# Altium schematic symbol library SignalCommunications.SCHLIB: 804 symbols (part 4 of 9) (continued)
## WE-SD_7447150
designator L?, comment <b>Leaded Wire Wound Rodcore Inductor WE-SD HIGH CURRENT</b><p> / - Rated Current up to 20 A<br> / - Inductance is independent from rated DC current<br> / - Mechanical dimensions can be adjusted on customer request<br> / - High mechanical stability<p> / -- Swirching regulators<br> / -- Motors<br> / -- Power amplifiers<br> / -- Power supplies<br> / -- Especially designed for automotive industry<br> / -- Broadband filtering
footprint WE-SD_7447150
pins: 1, 2

## WE-SD_7447180
designator L?, comment <b>Leaded Wire Wound Rodcore Inductor WE-SD HIGH CURRENT</b><p> / - Rated Current up to 20 A<br> / - Inductance is independent from rated DC current<br> / - Mechanical dimensions can be adjusted on customer request<br> / - High mechanical stability<p> / -- Swirching regulators<br> / -- Motors<br> / -- Power amplifiers<br> / -- Power supplies<br> / -- Especially designed for automotive industry<br> / -- Broadband filtering
footprint WE-SD_7447180
pins: 1, 2

## WE-SD_744710203
designator L?, comment <b>Leaded Wire Wound Rodcore Inductor WE-SD HIGH CURRENT</b><p> / - Rated Current up to 20 A<br> / - Inductance is independent from rated DC current<br> / - Mechanical dimensions can be adjusted on customer request<br> / - High mechanical stability<p> / -- Swirching regulators<br> / -- Motors<br> / -- Power amplifiers<br> / -- Power supplies<br> / -- Especially designed for automotive industry<br> / -- Broadband filtering
footprint WE-SD_744710203
pins: 1, 2

## WE-SD_744710205
designator L?, comment <b>Leaded Wire Wound Rodcore Inductor WE-SD HIGH CURRENT</b><p> / - Rated Current up to 20 A<br> / - Inductance is independent from rated DC current<br> / - Mechanical dimensions can be adjusted on customer request<br> / - High mechanical stability<p> / -- Swirching regulators<br> / -- Motors<br> / -- Power amplifiers<br> / -- Power supplies<br> / -- Especially designed for automotive industry<br> / -- Broadband filtering
footprint WE-SD_744710205
pins: 1, 2

## WE-SD_744710210
designator L?, comment <b>Leaded Wire Wound Rodcore Inductor WE-SD HIGH CURRENT</b><p> / - Rated Current up to 20 A<br> / - Inductance is independent from rated DC current<br> / - Mechanical dimensions can be adjusted on customer request<br> / - High mechanical stability<p> / -- Swirching regulators<br> / -- Motors<br> / -- Power amplifiers<br> / -- Power supplies<br> / -- Especially designed for automotive industry<br> / -- Broadband filtering
footprint WE-SD_744710210
pins: 1, 2

## WE-SD_744710215
designator L?, comment <b>Leaded Wire Wound Rodcore Inductor WE-SD HIGH CURRENT</b><p> / - Rated Current up to 20 A<br> / - Inductance is independent from rated DC current<br> / - Mechanical dimensions can be adjusted on customer request<br> / - High mechanical stability<p> / -- Swirching regulators<br> / -- Motors<br> / -- Power amplifiers<br> / -- Power supplies<br> / -- Especially designed for automotive industry<br> / -- Broadband filtering
footprint WE-SD_744710215
pins: 1, 2

## WE-SD_744710603
designator L?, comment <b>Leaded Wire Wound Rodcore Inductor WE-SD HIGH CURRENT</b><p> / - Rated Current up to 20 A<br> / - Inductance is independent from rated DC current<br> / - Mechanical dimensions can be adjusted on customer request<br> / - High mechanical stability<p> / -- Swirching regulators<br> / -- Motors<br> / -- Power amplifiers<br> / -- Power supplies<br> / -- Especially designed for automotive industry<br> / -- Broadband filtering
footprint WE-SD_744710603
pins: 1, 2

## WE-SD_744710605
designator L?, comment <b>Leaded Wire Wound Rodcore Inductor WE-SD HIGH CURRENT</b><p> / - Rated Current up to 20 A<br> / - Inductance is independent from rated DC current<br> / - Mechanical dimensions can be adjusted on customer request<br> / - High mechanical stability<p> / -- Swirching regulators<br> / -- Motors<br> / -- Power amplifiers<br> / -- Power supplies<br> / -- Especially designed for automotive industry<br> / -- Broadband filtering
footprint WE-SD_744710605
pins: 1, 2

## WE-SD_744710610
designator L?, comment <b>Leaded Wire Wound Rodcore Inductor WE-SD HIGH CURRENT</b><p> / - Rated Current up to 20 A<br> / - Inductance is independent from rated DC current<br> / - Mechanical dimensions can be adjusted on customer request<br> / - High mechanical stability<p> / -- Swirching regulators<br> / -- Motors<br> / -- Power amplifiers<br> / -- Power supplies<br> / -- Especially designed for automotive industry<br> / -- Broadband filtering
footprint WE-SD_744710610
pins: 1, 2

## WE-SD_744710615
designator L?, comment <b>Leaded Wire Wound Rodcore Inductor WE-SD HIGH CURRENT</b><p> / - Rated Current up to 20 A<br> / - Inductance is independent from rated DC current<br> / - Mechanical dimensions can be adjusted on customer request<br> / - High mechanical stability<p> / -- Swirching regulators<br> / -- Motors<br> / -- Power amplifiers<br> / -- Power supplies<br> / -- Especially designed for automotive industry<br> / -- Broadband filtering
footprint WE-SD_744710615
pins: 1, 2

## WE-SD_744711003
designator L?, comment <b>Leaded Wire Wound Rodcore Inductor WE-SD HIGH CURRENT</b><p> / - Rated Current up to 20 A<br> / - Inductance is independent from rated DC current<br> / - Mechanical dimensions can be adjusted on customer request<br> / - High mechanical stability<p> / -- Swirching regulators<br> / -- Motors<br> / -- Power amplifiers<br> / -- Power supplies<br> / -- Especially designed for automotive industry<br> / -- Broadband filtering
footprint WE-SD_744711003
pins: 1, 2

## WE-SD_744711005
designator L?, comment <b>Leaded Wire Wound Rodcore Inductor WE-SD HIGH CURRENT</b><p> / - Rated Current up to 20 A<br> / - Inductance is independent from rated DC current<br> / - Mechanical dimensions can be adjusted on customer request<br> / - High mechanical stability<p> / -- Swirching regulators<br> / -- Motors<br> / -- Power amplifiers<br> / -- Power supplies<br> / -- Especially designed for automotive industry<br> / -- Broadband filtering
footprint WE-SD_744711005
pins: 1, 2

## WE-SD_744711010
designator L?, comment <b>Leaded Wire Wound Rodcore Inductor WE-SD HIGH CURRENT</b><p> / - Rated Current up to 20 A<br> / - Inductance is independent from rated DC current<br> / - Mechanical dimensions can be adjusted on customer request<br> / - High mechanical stability<p> / -- Swirching regulators<br> / -- Motors<br> / -- Power amplifiers<br> / -- Power supplies<br> / -- Especially designed for automotive industry<br> / -- Broadband filtering
footprint WE-SD_744711010
pins: 1, 2

## WE-SD_744711015
designator L?, comment <b>Leaded Wire Wound Rodcore Inductor WE-SD HIGH CURRENT</b><p> / - Rated Current up to 20 A<br> / - Inductance is independent from rated DC current<br> / - Mechanical dimensions can be adjusted on customer request<br> / - High mechanical stability<p> / -- Swirching regulators<br> / -- Motors<br> / -- Power amplifiers<br> / -- Power supplies<br> / -- Especially designed for automotive industry<br> / -- Broadband filtering
footprint WE-SD_744711015
pins: 1, 2

## WE-SEFC-0148
designator L?, comment <b>SMD EMI Contact Finger WE-SECF</b><p> / <b>Characteristics : </b><p> / Suitable for automated placement <br> / Material: copper-beryllium (CuBe) gold-plated (AU)<br> / Different types and sizes available <br> / Corrossion-resistant<br> / Wear-resistant <br> / High temperatures and mechenical weight have no influence on the excellent connection properties <br> / Reliable solderability <br> / Customize materials and platings are possible <br> / Customized types and sizes are possible<br> / <br> / <b>APPLICATIONS :</b><p> / Contact between PCB's earth and housing  <br> / Low Ω HF connection between earthing points of two PCB's lying upon each other <br> / Earthing of cooling units on high frequency  <br> / Connection between signal and power supply of two PCB's on track  <br> / Connection between PCB's and extern elements  <br>
MANUFACTURER: Würth Elektronik eiSos GmbH; CREATED-BY: Christin Otto; COMPANY-URL: http://www.we-online.de; CREATED-DATE: MAR 2013; DATASHEET-URL: http://katalog.we-online.de/pbs/datasheet/331011452048.pdf
footprint WE-SECF_0148
pins: 1 P$1 (power)

## WE-SEFC-0315
designator L?, comment <b>SMD EMI Contact Finger WE-SECF</b><p> / <b>Characteristics : </b><p> / Suitable for automated placement <br> / Material: copper-beryllium (CuBe) gold-plated (AU)<br> / Different types and sizes available <br> / Corrossion-resistant<br> / Wear-resistant <br> / High temperatures and mechenical weight have no influence on the excellent connection properties <br> / Reliable solderability <br> / Customize materials and platings are possible <br> / Customized types and sizes are possible<br> / <br> / <b>APPLICATIONS :</b><p> / Contact between PCB's earth and housing  <br> / Low Ω HF connection between earthing points of two PCB's lying upon each other <br> / Earthing of cooling units on high frequency  <br> / Connection between signal and power supply of two PCB's on track  <br> / Connection between PCB's and extern elements  <br>
MANUFACTURER: Würth Elektronik eiSos GmbH; CREATED-BY: Christin Otto; COMPANY-URL: http://www.we-online.de; CREATED-DATE: MAR 2013; DATASHEET-URL: http://katalog.we-online.de/pbs/datasheet/331031321515.pdf
footprint WE-SECF_0315
pins: 1 P$1 (power)

## WE-SEFC-0320
designator L?, comment <b>SMD EMI Contact Finger WE-SECF</b><p> / <b>Characteristics : </b><p> / Suitable for automated placement <br> / Material: copper-beryllium (CuBe) gold-plated (AU)<br> / Different types and sizes available <br> / Corrossion-resistant<br> / Wear-resistant <br> / High temperatures and mechenical weight have no influence on the excellent connection properties <br> / Reliable solderability <br> / Customize materials and platings are possible <br> / Customized types and sizes are possible<br> / <br> / <b>APPLICATIONS :</b><p> / Contact between PCB's earth and housing  <br> / Low Ω HF connection between earthing points of two PCB's lying upon each other <br> / Earthing of cooling units on high frequency  <br> / Connection between signal and power supply of two PCB's on track  <br> / Connection between PCB's and extern elements  <br>
MANUFACTURER: Würth Elektronik eiSos GmbH; CREATED-BY: Christin Otto; COMPANY-URL: http://www.we-online.de; CREATED-DATE: MAR 2013; DATASHEET-URL: http://katalog.we-online.de/pbs/datasheet/331031271520.pdf
footprint WE-SECF_0320
pins: 1 P$1 (power)

## WE-SEFC-0453
designator L?, comment <b>SMD EMI Contact Finger WE-SECF</b><p> / <b>Characteristics : </b><p> / Suitable for automated placement <br> / Material: copper-beryllium (CuBe) gold-plated (AU)<br> / Different types and sizes available <br> / Corrossion-resistant<br> / Wear-resistant <br> / High temperatures and mechenical weight have no influence on the excellent connection properties <br> / Reliable solderability <br> / Customize materials and platings are possible <br> / Customized types and sizes are possible<br> / <br> / <b>APPLICATIONS :</b><p> / Contact between PCB's earth and housing  <br> / Low Ω HF connection between earthing points of two PCB's lying upon each other <br> / Earthing of cooling units on high frequency  <br> / Connection between signal and power supply of two PCB's on track  <br> / Connection between PCB's and extern elements  <br>
MANUFACTURER: Würth Elektronik eiSos GmbH; CREATED-BY: Christin Otto; COMPANY-URL: http://www.we-online.de; CREATED-DATE: MAR 2013; DATASHEET-URL: http://katalog.we-online.de/pbs/datasheet/331041402053.pdf
footprint WE-SECF_0453
pins: 1 P$1 (power)

## WE-SEFC-0557
designator L?, comment <b>SMD EMI Contact Finger WE-SECF</b><p> / <b>Characteristics : </b><p> / Suitable for automated placement <br> / Material: copper-beryllium (CuBe) gold-plated (AU)<br> / Different types and sizes available <br> / Corrossion-resistant<br> / Wear-resistant <br> / High temperatures and mechenical weight have no influence on the excellent connection properties <br> / Reliable solderability <br> / Customize materials and platings are possible <br> / Customized types and sizes are possible<br> / <br> / <b>APPLICATIONS :</b><p> / Contact between PCB's earth and housing  <br> / Low Ω HF connection between earthing points of two PCB's lying upon each other <br> / Earthing of cooling units on high frequency  <br> / Connection between signal and power supply of two PCB's on track  <br> / Connection between PCB's and extern elements  <br>
MANUFACTURER: Würth Elektronik eiSos GmbH; CREATED-BY: Christin Otto; COMPANY-URL: http://www.we-online.de; CREATED-DATE: MAR 2013; DATASHEET-URL: http://katalog.we-online.de/pbs/datasheet/331051472057.pdf
footprint WE-SECF-0557
pins: 1 P$1 (power)

## WE-SEFC-0610
designator L?, comment <b>SMD EMI Contact Finger WE-SECF</b><p> / <b>Characteristics : </b><p> / Suitable for automated placement <br> / Material: copper-beryllium (CuBe) gold-plated (AU)<br> / Different types and sizes available <br> / Corrossion-resistant<br> / Wear-resistant <br> / High temperatures and mechenical weight have no influence on the excellent connection properties <br> / Reliable solderability <br> / Customize materials and platings are possible <br> / Customized types and sizes are possible<br> / <br> / <b>APPLICATIONS :</b><p> / Contact between PCB's earth and housing  <br> / Low Ω HF connection between earthing points of two PCB's lying upon each other <br> / Earthing of cooling units on high frequency  <br> / Connection between signal and power supply of two PCB's on track  <br> / Connection between PCB's and extern elements  <br>
MANUFACTURER: Würth Elektronik eiSos GmbH; CREATED-BY: Christin Otto; COMPANY-URL: http://www.we-online.de; CREATED-DATE: MAR 2013; DATASHEET-URL: http://katalog.we-online.de/pbs/datasheet/331061603010.pdf
footprint WE-SECF_0610
pins: 1 P$1 (power)

## WE-SEFC-0825
designator L?, comment <b>SMD EMI Contact Finger WE-SECF</b><p> / <b>Characteristics : </b><p> / Suitable for automated placement <br> / Material: copper-beryllium (CuBe) gold-plated (AU)<br> / Different types and sizes available <br> / Corrossion-resistant<br> / Wear-resistant <br> / High temperatures and mechenical weight have no influence on the excellent connection properties <br> / Reliable solderability <br> / Customize materials and platings are possible <br> / Customized types and sizes are possible<br> / <br> / <b>APPLICATIONS :</b><p> / Contact between PCB's earth and housing  <br> / Low Ω HF connection between earthing points of two PCB's lying upon each other <br> / Earthing of cooling units on high frequency  <br> / Connection between signal and power supply of two PCB's on track  <br> / Connection between PCB's and extern elements  <br>
MANUFACTURER: Würth Elektronik eiSos GmbH; CREATED-BY: Christin Otto; COMPANY-URL: http://www.we-online.de; CREATED-DATE: MAR 2013; DATASHEET-URL: http://katalog.we-online.de/pbs/datasheet/331081302025.pdf
footprint WE-SECF_0825
pins: 1 P$1 (power)

## WE-SEFC-1440
designator L?, comment <b>SMD EMI Contact Finger WE-SECF</b><p> / <b>Characteristics : </b><p> / Suitable for automated placement <br> / Material: copper-beryllium (CuBe) gold-plated (AU)<br> / Different types and sizes available <br> / Corrossion-resistant<br> / Wear-resistant <br> / High temperatures and mechenical weight have no influence on the excellent connection properties <br> / Reliable solderability <br> / Customize materials and platings are possible <br> / Customized types and sizes are possible<br> / <br> / <b>APPLICATIONS :</b><p> / Contact between PCB's earth and housing  <br> / Low Ω HF connection between earthing points of two PCB's lying upon each other <br> / Earthing of cooling units on high frequency  <br> / Connection between signal and power supply of two PCB's on track  <br> / Connection between PCB's and extern elements  <br>
MANUFACTURER: Würth Elektronik eiSos GmbH; CREATED-BY: Christin Otto; COMPANY-URL: http://www.we-online.de; CREATED-DATE: MAR 2013; DATASHEET-URL: http://katalog.we-online.de/pbs/datasheet/331141352540.pdf
footprint WE-SECF_1440
pins: 1 P$1 (power)

## WE-SEFC-1562
designator L?, comment <b>SMD EMI Contact Finger WE-SECF</b><p> / <b>Characteristics : </b><p> / Suitable for automated placement <br> / Material: copper-beryllium (CuBe) gold-plated (AU)<br> / Different types and sizes available <br> / Corrossion-resistant<br> / Wear-resistant <br> / High temperatures and mechenical weight have no influence on the excellent connection properties <br> / Reliable solderability <br> / Customize materials and platings are possible <br> / Customized types and sizes are possible<br> / <br> / <b>APPLICATIONS :</b><p> / Contact between PCB's earth and housing  <br> / Low Ω HF connection between earthing points of two PCB's lying upon each other <br> / Earthing of cooling units on high frequency  <br> / Connection between signal and power supply of two PCB's on track  <br> / Connection between PCB's and extern elements  <br>
MANUFACTURER: Würth Elektronik eiSos GmbH; CREATED-BY: Christin Otto; COMPANY-URL: http://www.we-online.de; CREATED-DATE: MAR 2013; DATASHEET-URL: http://katalog.we-online.de/pbs/datasheet/331151702562.pdf
footprint WE-SECF-1562
pins: 1 P$1 (power)

## WE-SEFC-1613
designator L?, comment <b>SMD EMI Contact Finger WE-SECF</b><p> / <b>Characteristics : </b><p> / Suitable for automated placement <br> / Material: copper-beryllium (CuBe) gold-plated (AU)<br> / Different types and sizes available <br> / Corrossion-resistant<br> / Wear-resistant <br> / High temperatures and mechenical weight have no influence on the excellent connection properties <br> / Reliable solderability <br> / Customize materials and platings are possible <br> / Customized types and sizes are possible<br> / <br> / <b>APPLICATIONS :</b><p> / Contact between PCB's earth and housing  <br> / Low Ω HF connection between earthing points of two PCB's lying upon each other <br> / Earthing of cooling units on high frequency  <br> / Connection between signal and power supply of two PCB's on track  <br> / Connection between PCB's and extern elements  <br>
MANUFACTURER: Würth Elektronik eiSos GmbH; CREATED-BY: Christin Otto; COMPANY-URL: http://www.we-online.de; CREATED-DATE: MAR 2013; DATASHEET-URL: http://katalog.we-online.de/pbs/datasheet/331161702513.pdf
footprint WE-SECF_1613
pins: 1 P$1 (power)

## WE-SEFC-1670
designator L?, comment <b>SMD EMI Contact Finger WE-SECF</b><p> / <b>Characteristics : </b><p> / Suitable for automated placement <br> / Material: copper-beryllium (CuBe) gold-plated (AU)<br> / Different types and sizes available <br> / Corrossion-resistant<br> / Wear-resistant <br> / High temperatures and mechenical weight have no influence on the excellent connection properties <br> / Reliable solderability <br> / Customize materials and platings are possible <br> / Customized types and sizes are possible<br> / <br> / <b>APPLICATIONS :</b><p> / Contact between PCB's earth and housing  <br> / Low Ω HF connection between earthing points of two PCB's lying upon each other <br> / Earthing of cooling units on high frequency  <br> / Connection between signal and power supply of two PCB's on track  <br> / Connection between PCB's and extern elements  <br>
MANUFACTURER: Würth Elektronik eiSos GmbH; CREATED-BY: Christin Otto; COMPANY-URL: http://www.we-online.de; CREATED-DATE: MAR 2013; DATASHEET-URL: http://katalog.we-online.de/pbs/datasheet/331161452070.pdf
footprint WE-SECF_1670
pins: 1 P$1 (power)

## WE-SEFC-1730
designator L?, comment <b>SMD EMI Contact Finger WE-SECF</b><p> / <b>Characteristics : </b><p> / Suitable for automated placement <br> / Material: copper-beryllium (CuBe) gold-plated (AU)<br> / Different types and sizes available <br> / Corrossion-resistant<br> / Wear-resistant <br> / High temperatures and mechenical weight have no influence on the excellent connection properties <br> / Reliable solderability <br> / Customize materials and platings are possible <br> / Customized types and sizes are possible<br> / <br> / <b>APPLICATIONS :</b><p> / Contact between PCB's earth and housing  <br> / Low Ω HF connection between earthing points of two PCB's lying upon each other <br> / Earthing of cooling units on high frequency  <br> / Connection between signal and power supply of two PCB's on track  <br> / Connection between PCB's and extern elements  <br>
MANUFACTURER: Würth Elektronik eiSos GmbH; CREATED-BY: Christin Otto; COMPANY-URL: http://www.we-online.de; CREATED-DATE: MAR 2013; DATASHEET-URL: http://katalog.we-online.de/pbs/datasheet/331171302030.pdf
footprint WE-SECF_1730
pins: 1 P$1 (power)

## WE-SEFC-1735
designator L?, comment <b>SMD EMI Contact Finger WE-SECF</b><p> / <b>Characteristics : </b><p> / Suitable for automated placement <br> / Material: copper-beryllium (CuBe) gold-plated (AU)<br> / Different types and sizes available <br> / Corrossion-resistant<br> / Wear-resistant <br> / High temperatures and mechenical weight have no influence on the excellent connection properties <br> / Reliable solderability <br> / Customize materials and platings are possible <br> / Customized types and sizes are possible<br> / <br> / <b>APPLICATIONS :</b><p> / Contact between PCB's earth and housing  <br> / Low Ω HF connection between earthing points of two PCB's lying upon each other <br> / Earthing of cooling units on high frequency  <br> / Connection between signal and power supply of two PCB's on track  <br> / Connection between PCB's and extern elements  <br>
MANUFACTURER: Würth Elektronik eiSos GmbH; CREATED-BY: Christin Otto; COMPANY-URL: http://www.we-online.de; CREATED-DATE: MAR 2013; DATASHEET-URL: http://katalog.we-online.de/pbs/datasheet/331171302035.pdf
footprint WE-SECF_1735
pins: 1 P$1 (power)

## WE-SEFC-2140
designator L?, comment <b>SMD EMI Contact Finger WE-SECF</b><p> / <b>Characteristics : </b><p> / Suitable for automated placement <br> / Material: copper-beryllium (CuBe) gold-plated (AU)<br> / Different types and sizes available <br> / Corrossion-resistant<br> / Wear-resistant <br> / High temperatures and mechenical weight have no influence on the excellent connection properties <br> / Reliable solderability <br> / Customize materials and platings are possible <br> / Customized types and sizes are possible<br> / <br> / <b>APPLICATIONS :</b><p> / Contact between PCB's earth and housing  <br> / Low Ω HF connection between earthing points of two PCB's lying upon each other <br> / Earthing of cooling units on high frequency  <br> / Connection between signal and power supply of two PCB's on track  <br> / Connection between PCB's and extern elements  <br>
MANUFACTURER: Würth Elektronik eiSos GmbH; CREATED-BY: Christin Otto; COMPANY-URL: http://www.we-online.de; CREATED-DATE: MAR 2013; DATASHEET-URL: http://katalog.we-online.de/pbs/datasheet/331211503040.pdf
footprint WE-SECF_2140
pins: 1 P$1 (power)

## WE-SEFC-2240
designator L?, comment <b>SMD EMI Contact Finger WE-SECF</b><p> / <b>Characteristics : </b><p> / Suitable for automated placement <br> / Material: copper-beryllium (CuBe) gold-plated (AU)<br> / Different types and sizes available <br> / Corrossion-resistant<br> / Wear-resistant <br> / High temperatures and mechenical weight have no influence on the excellent connection properties <br> / Reliable solderability <br> / Customize materials and platings are possible <br> / Customized types and sizes are possible<br> / <br> / <b>APPLICATIONS :</b><p> / Contact between PCB's earth and housing  <br> / Low Ω HF connection between earthing points of two PCB's lying upon each other <br> / Earthing of cooling units on high frequency  <br> / Connection between signal and power supply of two PCB's on track  <br> / Connection between PCB's and extern elements  <br>
MANUFACTURER: Würth Elektronik eiSos GmbH; CREATED-BY: Christin Otto; COMPANY-URL: http://www.we-online.de; CREATED-DATE: MAR 2013; DATASHEET-URL: http://katalog.we-online.de/pbs/datasheet/331221602040.pdf
footprint WE-SECF_2240
pins: 1 P$1 (power)

## WE-SHC_36103205
designator S?, comment WE-SHC Shielding cabinet
footprint WE-SHC_36103205
pins: 1 GND (power)

## WE-SHC_36103255
designator S?, comment WE-SHC Shielding cabinet
footprint WE-SHC_36103255
pins: 1 GND (power)

## WE-SHC_36103305
designator S?, comment WE-SHC Shielding cabinet
footprint WE-SHC_36103305
pins: 1 GND (power)

## WE-SHC_36103505
designator S?, comment WE-SHC Shielding cabinet
footprint WE-SHC_36103505
pins: 1 GND (power)

## WE-SHC_36103605
designator S?, comment WE-SHC Shielding cabinet
footprint WE-SHC_36103605
pins: 1 GND (power)

## WE-SHC_36503205
designator S?, comment WE-SHC Shielding cabinet
footprint WE-SHC_36503205
pins: 1 GND (power)

## WE-SHC_36503255
designator S?, comment WE-SHC Shielding cabinet
footprint WE-SHC_36503255
pins: 1 GND (power)

## WE-SHC_36503305
designator S?, comment WE-SHC Shielding cabinet
footprint WE-SHC_36503305
pins: 1 GND (power)

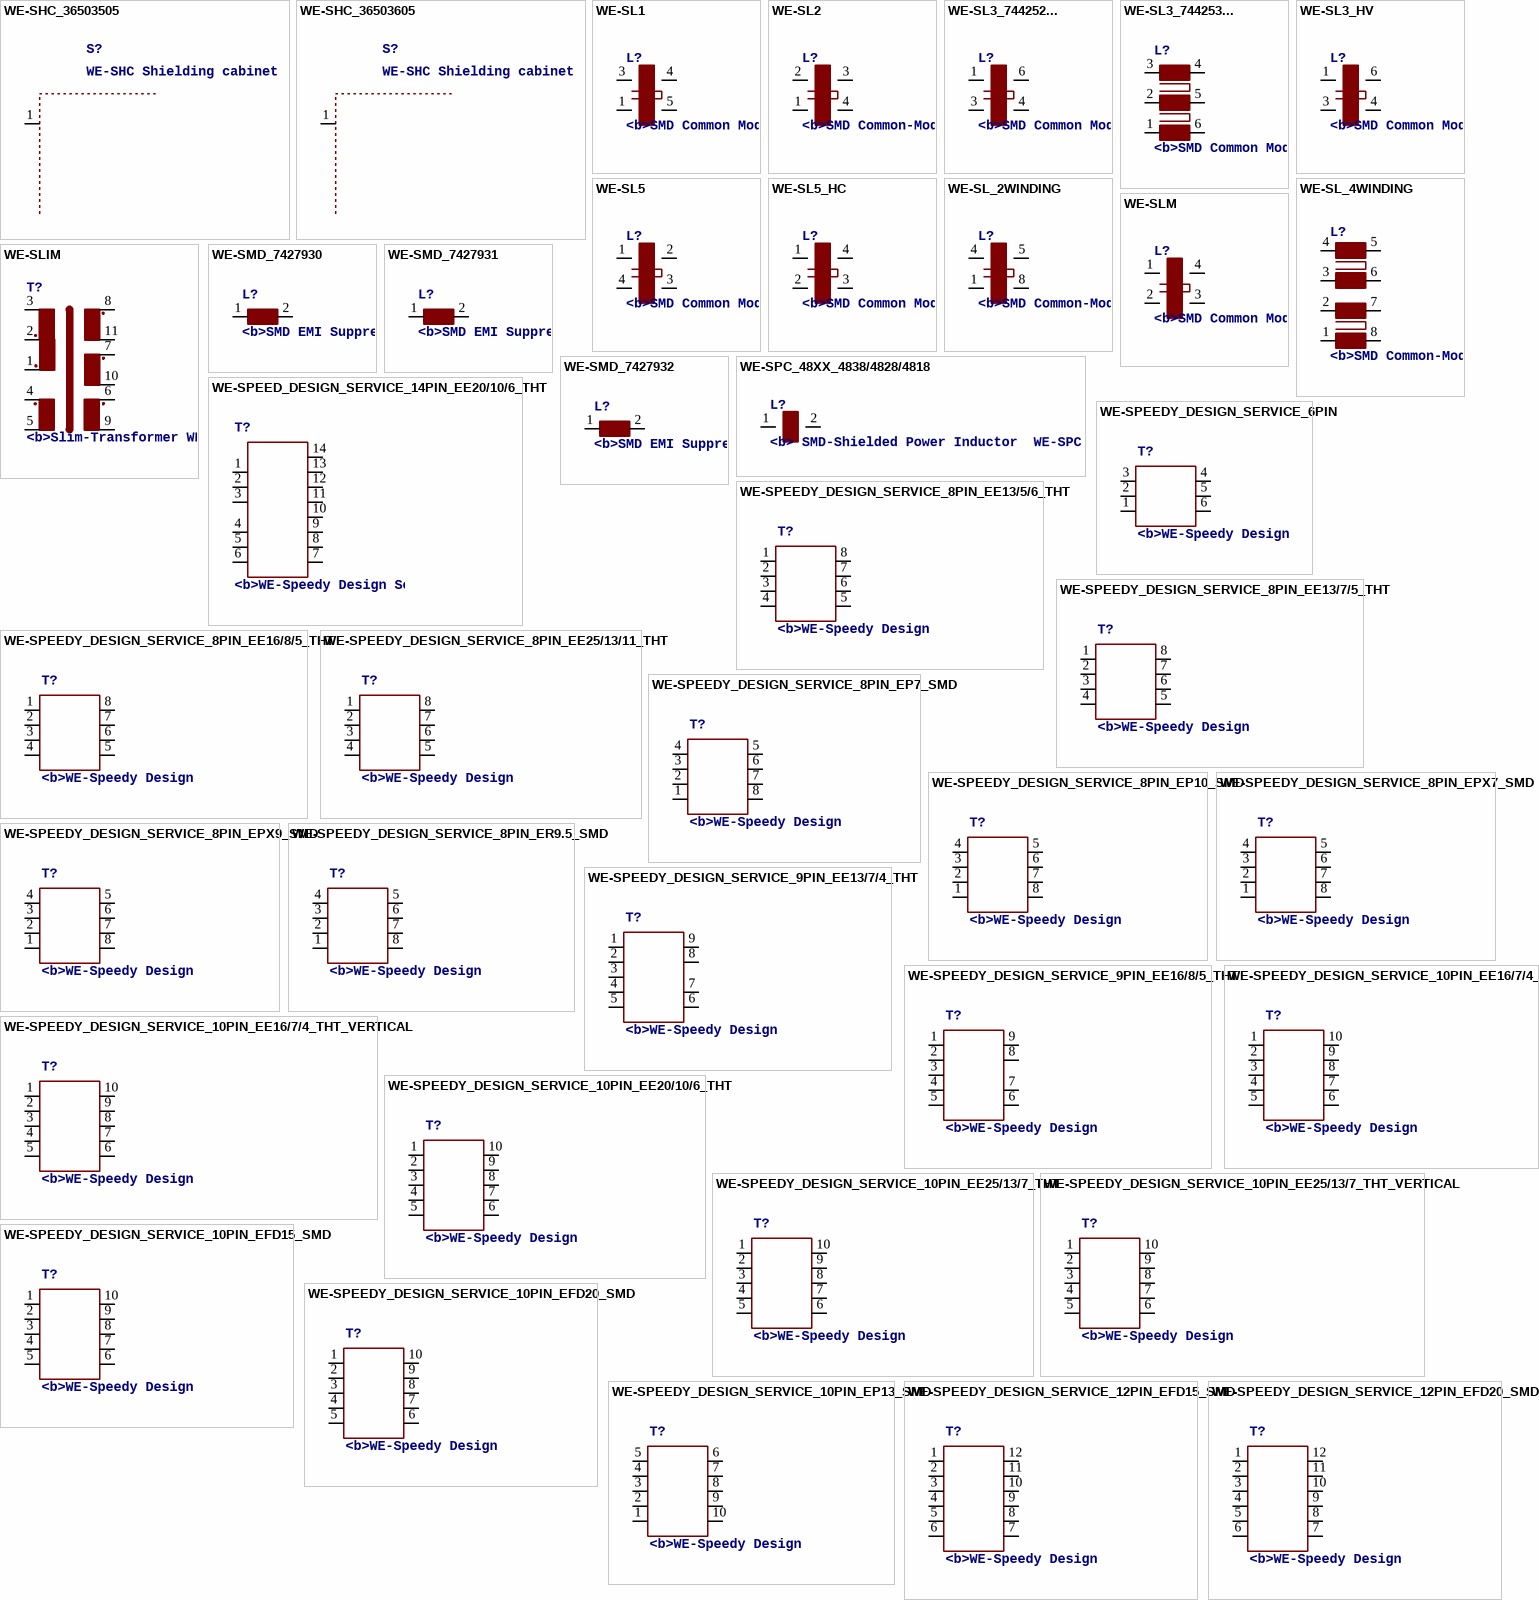
[diagram p31: symbols WE-SHC_36503505 to WE-SPEEDY_DESIGN_SERVICE_12PIN_EFD20_SMD]

## WE-SHC_36503505
designator S?, comment WE-SHC Shielding cabinet
footprint WE-SHC_36503505
pins: 1 GND (power)

## WE-SHC_36503605
designator S?, comment WE-SHC Shielding cabinet
footprint WE-SHC_36503605
pins: 1 GND (power)

## WE-SL1
designator L?, comment <b>SMD Common Mode Line Filter WE-SL1</b><p> / - Small size<br> / - Low Profile, only 1,65 mm<br> / - High Impedance up to 2000 ohm<br> / - High Current up to 300mA <br> / - Low leakage inductance<br><br> / -- USB<br> / -- CAN<br> / -- Firewire<br> / -- Data Lines<br> / -- Power Lines<br>
footprint WE-SL1
pins: 1, 3, 4, 5 2

## WE-SL2
designator L?, comment <b>SMD Common-Mode Line Filter WE-SL2</b><p> / For distortion-free removal of noise from transmitted / electrical signals<br> / - Double current-compensated choke<br> / - Offering a wide band width with the core materials NiZn/MnZn<br><br> / -- Current compensated choke for data and signal lines<br> / -- Power supply systems<br> / -- Filter for measurement signals<br> / -- CAN
footprint WE-SL2
pins: 1, 2 3, 3 4, 4 2

## WE-SL3_744252...
designator L?, comment <b>SMD Common Mode Line Filter WE-SL3</b><p> / - Small size<br> - Low Profile, only 2.5 mm<br>- High Impedance tp to 5000 ohm<br>- High Current up to 700mA <br> / - Low leakage inductance<p> / - USB<br> / - CAN<br> / -  Firewire<br> / - Data Lines<br> / - Power Lines<br>
footprint WE-SL3_744252...
pins: 1 3, 3 1, 4 2, 6 4

## WE-SL3_744253...
designator L?, comment <b>SMD Common Mode Line Filter WE-SL3</b><p> / - Small size<br> - Low Profile, only 2.5 mm<br>- High Impedance tp to 5000 ohm<br>- High Current up to 700mA <br> / - Low leakage inductance<p> / - USB<br> / - CAN<br> / -  Firewire<br> / - Data Lines<br> / - Power Lines<br>
footprint WE-SL3_744253...
pins: 1 3, 2, 3 1, 4 6, 5, 6 4

## WE-SL3_HV
designator L?, comment <b>SMD Common Mode Line Filter WE-SL3 HV with 1.5 kV Isolation Voltage</b><p> / - 1.5 kV isolation voltage <br> / - Low profile<br> / - Small sinze<br> / - Excellent attenuation characteristics<br><br> / -- 10/100/1000 Base-T<br> / -- xDSL<br> / -- Modem<br> / -- T1/E1<br> / -- ISDN<br> / -- For TNV-circuits
footprint WE-SL3_HV
pins: 1 3, 3 1, 4 2, 6 4

## WE-SL5
designator L?, comment <b>SMD Common Mode Line Filter WE-SL5</b><p> / - Small size<br> / - Low Profile<br> / - High Impedance up to 13000 ohm<br> / - High Current up to 2500mA <P> / -- Data Lines<br> / -- Power Lines
footprint WE-SL5
pins: 1 3, 2 4, 3 2, 4 1

## WE-SL5_HC
designator L?, comment <b>SMD Common Mode WE-SL5</b><p> / - Small size<br> / - Low Profile<br> / - High Impedance up to 1000 ohm<br> / - High Current up to 5000mA <P> / -- Data Lines<br> / -- Power Lines
footprint WE-SL5_HC
pins: 1 3, 2 1, 3 2, 4

## WE-SL_2WINDING
designator L?, comment <b>SMD Common-Mode Choke Line Filter WE-SL</b><p> / For distortion-free removal of noise from transmitted / electrical signals<br> / - 2 or 4 winding configuration<br> / - Offering a wide band width with the core materials of NiZn and MnZn<br><br> / -- Current compensated choke for data and signal lines<br> / -- USB/CAN/ISDN-Bus<br> / -- Power supply systems<br> / -- Control lines<br> / -- LAN, PBX, cable TV, CD-ROM, 8mm video, etc.
footprint WE-SL_2WINDING
pins: 1, 4 3, 5 4, 8 2

## WE-SL_4WINDING
designator L?, comment <b>SMD Common-Mode Choke Line Filter WE-SL</b><p> / For distortion-free removal of noise from transmitted / electrical signals<br> / - 2 or 4 winding configuration<br> / - Offering a wide band width with the core materials of NiZn and MnZn<br><br> / -- Current compensated choke for data and signal lines<br> / -- USB/CAN/ISDN-Bus<br> / -- Power supply systems<br> / -- Control lines<br> / -- LAN, PBX, cable TV, CD-ROM, 8mm video, etc.
footprint WE-SL_4WINDING
pins: 1 4, 2 3, 3 2, 4 1, 5 8, 6 7, 7 6, 8 5

## WE-SLIM
designator T?, comment <b>Slim-Transformer WE-SLIM</b><br><br> / - total hight 12.0 mm max.<br> / - height 8.0 mm above PCB<br> / - output power 65W<br><br> / -- offline switch mode power supplies<br> / -- TV<br> / -- devices with heigh issues
footprint WE_LEP28/11.2_6PIN
pins: 1, 2, 3, 4, 5, 6, 7, 8, 9, 10, 11

## WE-SLM
designator L?, comment <b>SMD Common Mode Line Filter WE-SLM</b><p> / - Small size<br> / - Low Profile<br> / - High Impedance<br> / - High current capability up to 300 mA<p> / -- USB<br> / -- CAN<br> / -- Firewire<br> / -- Data Lines<br> / -- Power supply systems<br> / -- Signal Lines
footprint WE-SLM
pins: 1 3, 2 1, 3 2, 4

## WE-SMD_7427930
designator L?, comment <b>SMD EMI Suppression Ferrite Beads (High Current)</b><br><br> / For applications where you need low DC resistance
footprint WE-SMD_7427930
pins: 1, 2

## WE-SMD_7427931
designator L?, comment <b>SMD EMI Suppression Ferrite Beads (High Current)</b><br><br> / For applications where you need low DC resistance
footprint WE-SMD_7427931
pins: 1, 2

## WE-SMD_7427932
designator L?, comment <b>SMD EMI Suppression Ferrite Beads (High Current)</b><br><br> / For applications where you need low DC resistance
footprint WE-SMD_7427932
pins: 1, 2

## WE-SPC_48XX_4838/4828/4818
designator L?, comment <b> SMD-Shielded Power Inductor  WE-SPC
footprint WE-SPC_48XX
pins: 1, 2

## WE-SPEED_DESIGN_SERVICE_14PIN_EE20/10/6_THT
designator T?, comment <b>WE-Speedy Design Service, 14 Pin</b><br><br> / - Any application that fits package style <br> / - Switch Mode Power: Flyback, Forward, Push-Pull, Coupled Inductor<br><br> / -- Telecom Applications: xDSL, POTS Splitter Inductors
footprint WE_EE20/10/6_THT_HORIZONTAL_14PIN
pins: 1, 2, 3, 4, 5, 6, 7, 8, 9, 10, 11, 12, 13, 14

## WE-SPEEDY_DESIGN_SERVICE_6PIN
designator T?, comment <b>WE-Speedy Design Service, 6 Pin</b><br><br> / - Any application that fits package style <br> / - Switch Mode Power: Flyback, Forward, Push-Pull, Coupled Inductor<br><br> / -- Telecom Applications: xDSL, POTS Splitter Inductors
footprint WE_EP5_SMD_6PIN
pins: 1, 2, 3, 4, 5, 6

## WE-SPEEDY_DESIGN_SERVICE_8PIN_EE13/5/6_THT
designator T?, comment <b>WE-Speedy Design Service, 8 Pin</b><br><br> / - Any application that fits package style <br> / - Switch Mode Power: Flyback, Forward, Push-Pull, Coupled Inductor<br><br> / -- Telecom Applications: xDSL, POTS Splitter Inductors
footprint WE_EE13/5/6_HORIZONTAL_8PIN
pins: 1 4, 2 3, 3 2, 4 1, 5 8, 6 7, 7 6, 8 5

## WE-SPEEDY_DESIGN_SERVICE_8PIN_EE13/7/5_THT
designator T?, comment <b>WE-Speedy Design Service, 8 Pin</b><br><br> / - Any application that fits package style <br> / - Switch Mode Power: Flyback, Forward, Push-Pull, Coupled Inductor<br><br> / -- Telecom Applications: xDSL, POTS Splitter Inductors
footprint WE_EE13/7/4_HORIZONTAL_8PIN
pins: 1 4, 2 3, 3 2, 4 1, 5 8, 6 7, 7 6, 8 5

## WE-SPEEDY_DESIGN_SERVICE_8PIN_EE16/8/5_THT
designator T?, comment <b>WE-Speedy Design Service, 8 Pin</b><br><br> / - Any application that fits package style <br> / - Switch Mode Power: Flyback, Forward, Push-Pull, Coupled Inductor<br><br> / -- Telecom Applications: xDSL, POTS Splitter Inductors
footprint WE_EE16/8/5_THT_HORIZONTAL_8PIN
pins: 1 4, 2 3, 3 2, 4 1, 5 8, 6 7, 7 6, 8 5

## WE-SPEEDY_DESIGN_SERVICE_8PIN_EE25/13/11_THT
designator T?, comment <b>WE-Speedy Design Service, 8 Pin</b><br><br> / - Any application that fits package style <br> / - Switch Mode Power: Flyback, Forward, Push-Pull, Coupled Inductor<br><br> / -- Telecom Applications: xDSL, POTS Splitter Inductors
footprint WE_EE25/13/11_THT_VERTICAL_8PIN
pins: 1 4, 2 3, 3 2, 4 1, 5 8, 6 7, 7 6, 8 5

## WE-SPEEDY_DESIGN_SERVICE_8PIN_EP7_SMD
designator T?, comment <b>WE-Speedy Design Service, 8 Pin</b><br><br> / - Any application that fits package style <br> / - Switch Mode Power: Flyback, Forward, Push-Pull, Coupled Inductor<br><br> / -- Telecom Applications: xDSL, POTS Splitter Inductors
footprint WE_EP7_SMD_8PIN
pins: 1, 2, 3, 4, 5, 6, 7, 8

## WE-SPEEDY_DESIGN_SERVICE_8PIN_EP10_SMD
designator T?, comment <b>WE-Speedy Design Service, 8 Pin</b><br><br> / - Any application that fits package style <br> / - Switch Mode Power: Flyback, Forward, Push-Pull, Coupled Inductor<br><br> / -- Telecom Applications: xDSL, POTS Splitter Inductors
footprint WE_EP10_SMD_8PIN
pins: 1, 2, 3, 4, 5, 6, 7, 8

## WE-SPEEDY_DESIGN_SERVICE_8PIN_EPX7_SMD
designator T?, comment <b>WE-Speedy Design Service, 8 Pin</b><br><br> / - Any application that fits package style <br> / - Switch Mode Power: Flyback, Forward, Push-Pull, Coupled Inductor<br><br> / -- Telecom Applications: xDSL, POTS Splitter Inductors
footprint WE_EPX7_SMD_8PIN
pins: 1, 2, 3, 4, 5, 6, 7, 8

## WE-SPEEDY_DESIGN_SERVICE_8PIN_EPX9_SMD
designator T?, comment <b>WE-Speedy Design Service, 8 Pin</b><br><br> / - Any application that fits package style <br> / - Switch Mode Power: Flyback, Forward, Push-Pull, Coupled Inductor<br><br> / -- Telecom Applications: xDSL, POTS Splitter Inductors
footprint WE_EPX9_SMD_8PIN
pins: 1, 2, 3, 4, 5, 6, 7, 8

## WE-SPEEDY_DESIGN_SERVICE_8PIN_ER9.5_SMD
designator T?, comment <b>WE-Speedy Design Service, 8 Pin</b><br><br> / - Any application that fits package style <br> / - Switch Mode Power: Flyback, Forward, Push-Pull, Coupled Inductor<br><br> / -- Telecom Applications: xDSL, POTS Splitter Inductors
footprint WE_ER9.5_SMD_8PIN
pins: 1, 2, 3, 4, 5, 6, 7, 8

## WE-SPEEDY_DESIGN_SERVICE_9PIN_EE13/7/4_THT
designator T?, comment <b>WE-Speedy Design Service, 9 Pin</b><br><br> / - Any application that fits package style <br> / - Switch Mode Power: Flyback, Forward, Push-Pull, Coupled Inductor<br><br> / -- Telecom Applications: xDSL, POTS Splitter Inductors
footprint WE_E13/7/4_THT_HORIZONTAL_9PIN
pins: 1 5, 2 4, 3, 4 2, 5 1, 6 9, 7 8, 8 7, 9 6

## WE-SPEEDY_DESIGN_SERVICE_9PIN_EE16/8/5_THT
designator T?, comment <b>WE-Speedy Design Service, 9 Pin</b><br><br> / - Any application that fits package style <br> / - Switch Mode Power: Flyback, Forward, Push-Pull, Coupled Inductor<br><br> / -- Telecom Applications: xDSL, POTS Splitter Inductors
footprint WE_EE16/8/5_THT_HORIZONTAL_9PIN
pins: 1 5, 2 4, 3, 4 2, 5 1, 6 9, 7 8, 8 7, 9 6

## WE-SPEEDY_DESIGN_SERVICE_10PIN_EE16/7/4_THT
designator T?, comment <b>WE-Speedy Design Service, 10 Pin</b><br><br> / - Any application that fits package style <br> / - Switch Mode Power: Flyback, Forward, Push-Pull, Coupled Inductor<br><br> / -- Telecom Applications: xDSL, POTS Splitter Inductors
footprint WE_EE16/7/4_THT_HORIZONTAL_10PIN
pins: 1, 2, 3, 4, 5, 6, 7, 8, 9, 10

## WE-SPEEDY_DESIGN_SERVICE_10PIN_EE16/7/4_THT_VERTICAL
designator T?, comment <b>WE-Speedy Design Service, 10 Pin</b><br><br> / - Any application that fits package style <br> / - Switch Mode Power: Flyback, Forward, Push-Pull, Coupled Inductor<br><br> / -- Telecom Applications: xDSL, POTS Splitter Inductors
footprint WE_E16/7/4_THT_VERTIKAL_10PIN
pins: 1, 2, 3, 4, 5, 6, 7, 8, 9, 10

## WE-SPEEDY_DESIGN_SERVICE_10PIN_EE20/10/6_THT
designator T?, comment <b>WE-Speedy Design Service, 10 Pin</b><br><br> / - Any application that fits package style <br> / - Switch Mode Power: Flyback, Forward, Push-Pull, Coupled Inductor<br><br> / -- Telecom Applications: xDSL, POTS Splitter Inductors
footprint WE_EE20/10/6_THT_HORIZONTAL_10PIN
pins: 1, 2, 3, 4, 5, 6, 7, 8, 9, 10

## WE-SPEEDY_DESIGN_SERVICE_10PIN_EE25/13/7_THT
designator T?, comment <b>WE-Speedy Design Service, 10 Pin</b><br><br> / - Any application that fits package style <br> / - Switch Mode Power: Flyback, Forward, Push-Pull, Coupled Inductor<br><br> / -- Telecom Applications: xDSL, POTS Splitter Inductors
footprint WE_EE25/13/7_THT_HORIZONTAL_10PIN
pins: 1, 2, 3, 4, 5, 6, 7, 8, 9, 10

## WE-SPEEDY_DESIGN_SERVICE_10PIN_EE25/13/7_THT_VERTICAL
designator T?, comment <b>WE-Speedy Design Service, 10 Pin</b><br><br> / - Any application that fits package style <br> / - Switch Mode Power: Flyback, Forward, Push-Pull, Coupled Inductor<br><br> / -- Telecom Applications: xDSL, POTS Splitter Inductors
footprint WE_EE25/13/7_THT_VERTICAL_10PIN
pins: 1, 2, 3, 4, 5, 6, 7, 8, 9, 10

## WE-SPEEDY_DESIGN_SERVICE_10PIN_EFD15_SMD
designator T?, comment <b>WE-Speedy Design Service, 10 Pin</b><br><br> / - Any application that fits package style <br> / - Switch Mode Power: Flyback, Forward, Push-Pull, Coupled Inductor<br><br> / -- Telecom Applications: xDSL, POTS Splitter Inductors
footprint WE_EFD15_SMD_10PIN
pins: 1, 2, 3, 4, 5, 6, 7, 8, 9, 10

## WE-SPEEDY_DESIGN_SERVICE_10PIN_EFD20_SMD
designator T?, comment <b>WE-Speedy Design Service, 10 Pin</b><br><br> / - Any application that fits package style <br> / - Switch Mode Power: Flyback, Forward, Push-Pull, Coupled Inductor<br><br> / -- Telecom Applications: xDSL, POTS Splitter Inductors
footprint WE_EFD20_SMD_10PIN
pins: 1, 2, 3, 4, 5, 6, 7, 8, 9, 10

## WE-SPEEDY_DESIGN_SERVICE_10PIN_EP13_SMD
designator T?, comment <b>WE-Speedy Design Service, 10 Pin</b><br><br> / - Any application that fits package style <br> / - Switch Mode Power: Flyback, Forward, Push-Pull, Coupled Inductor<br><br> / -- Telecom Applications: xDSL, POTS Splitter Inductors
footprint WE_EP13_SMD_10PIN
pins: 1 5, 2 4, 3, 4 2, 5 1, 6 10, 7 9, 8, 9 7, 10 6

## WE-SPEEDY_DESIGN_SERVICE_12PIN_EFD15_SMD
designator T?, comment <b>WE-Speedy Design Service, 12 Pin</b><br><br> / - Any application that fits package style <br> / - Switch Mode Power: Flyback, Forward, Push-Pull, Coupled Inductor<br><br> / -- Telecom Applications: xDSL, POTS Splitter Inductors
footprint WE_EFD15_SMD_12PIN
pins: 1, 2, 3, 4, 5, 6, 7, 8, 9, 10, 11, 12

## WE-SPEEDY_DESIGN_SERVICE_12PIN_EFD20_SMD
designator T?, comment <b>WE-Speedy Design Service, 12 Pin</b><br><br> / - Any application that fits package style <br> / - Switch Mode Power: Flyback, Forward, Push-Pull, Coupled Inductor<br><br> / -- Telecom Applications: xDSL, POTS Splitter Inductors
footprint WE_EFD20_SMD_12PIN
pins: 1, 2, 3, 4, 5, 6, 7, 8, 9, 10, 11, 12

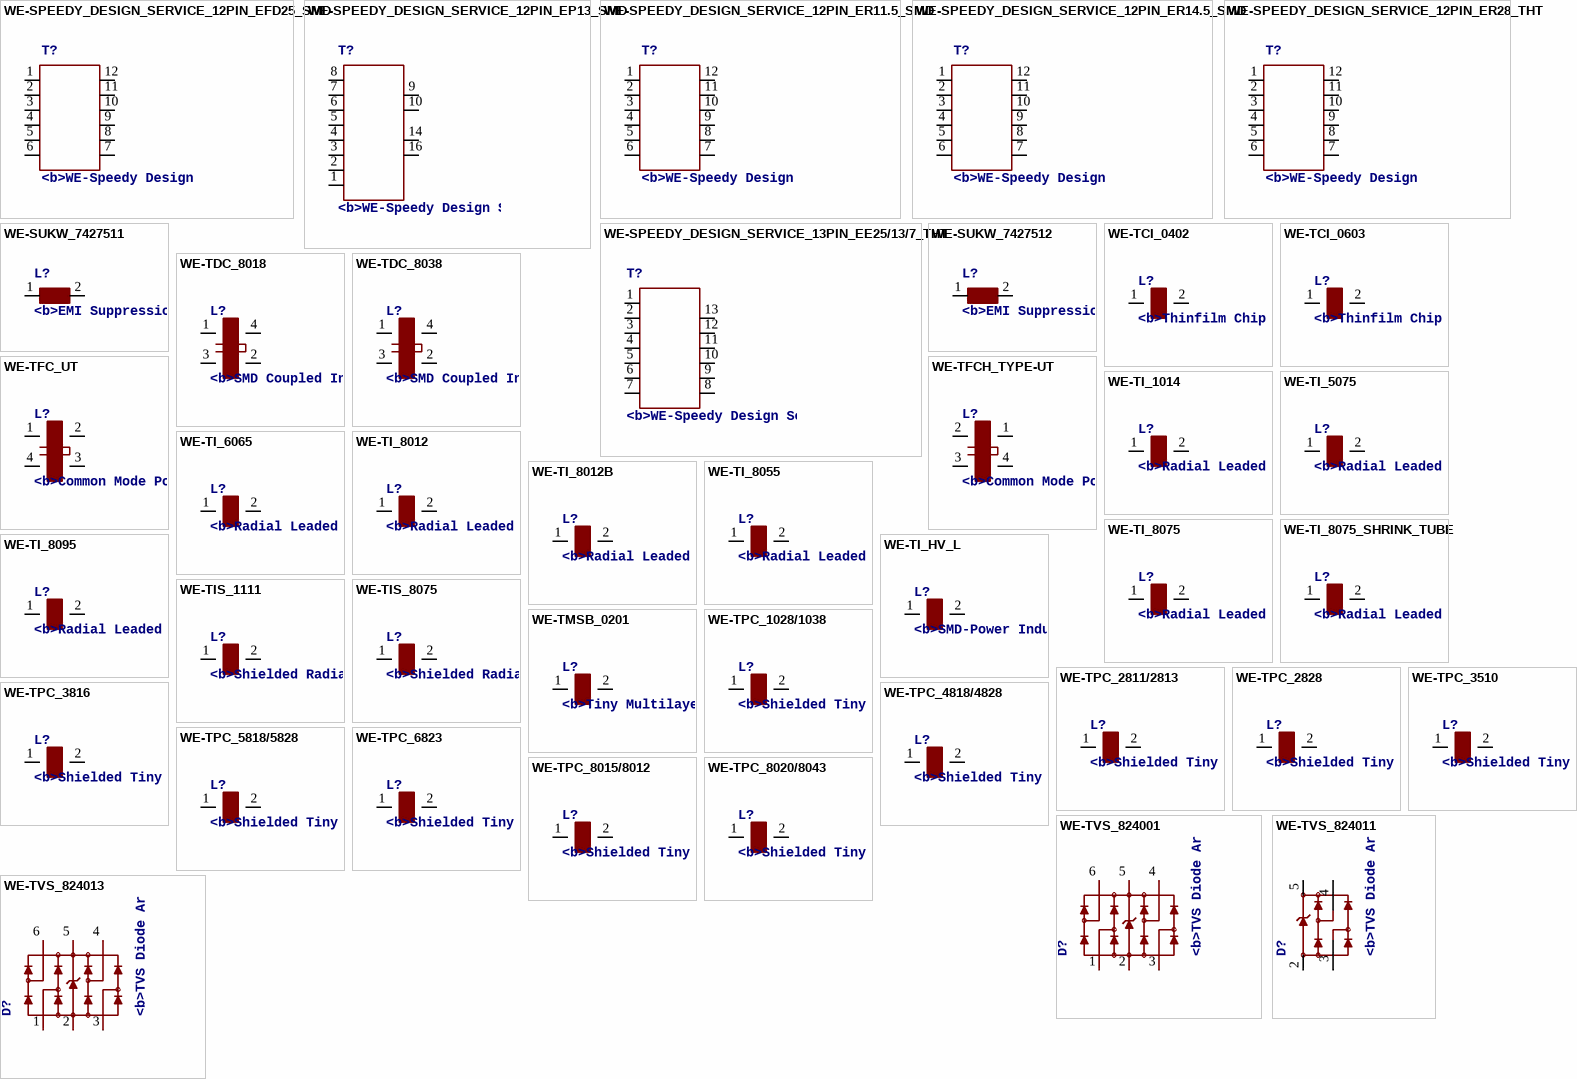
[diagram p32: symbols WE-SPEEDY_DESIGN_SERVICE_12PIN_EFD25_SMD to WE-TVS_824013]

## WE-SPEEDY_DESIGN_SERVICE_12PIN_EFD25_SMD
designator T?, comment <b>WE-Speedy Design Service, 12 Pin</b><br><br> / - Any application that fits package style <br> / - Switch Mode Power: Flyback, Forward, Push-Pull, Coupled Inductor<br><br> / -- Telecom Applications: xDSL, POTS Splitter Inductors
footprint WE_EFD25_SMD_12PIN
pins: 1, 2, 3, 4, 5, 6, 7, 8, 9, 10, 11, 12